# Altium footprint library Main_Board.PcbLib: 106 footprints (part 1 of 7)
Each footprint in its own frame and in the unit in brackets; x right, y up, seen from the top. Pads: shape width x height; smd on the part's side, far side on the other; paste and mask are expansions set on the pad; w line width, h text height; cw(c..) or ccw(c..) is an arc to the next point about the centre after c.
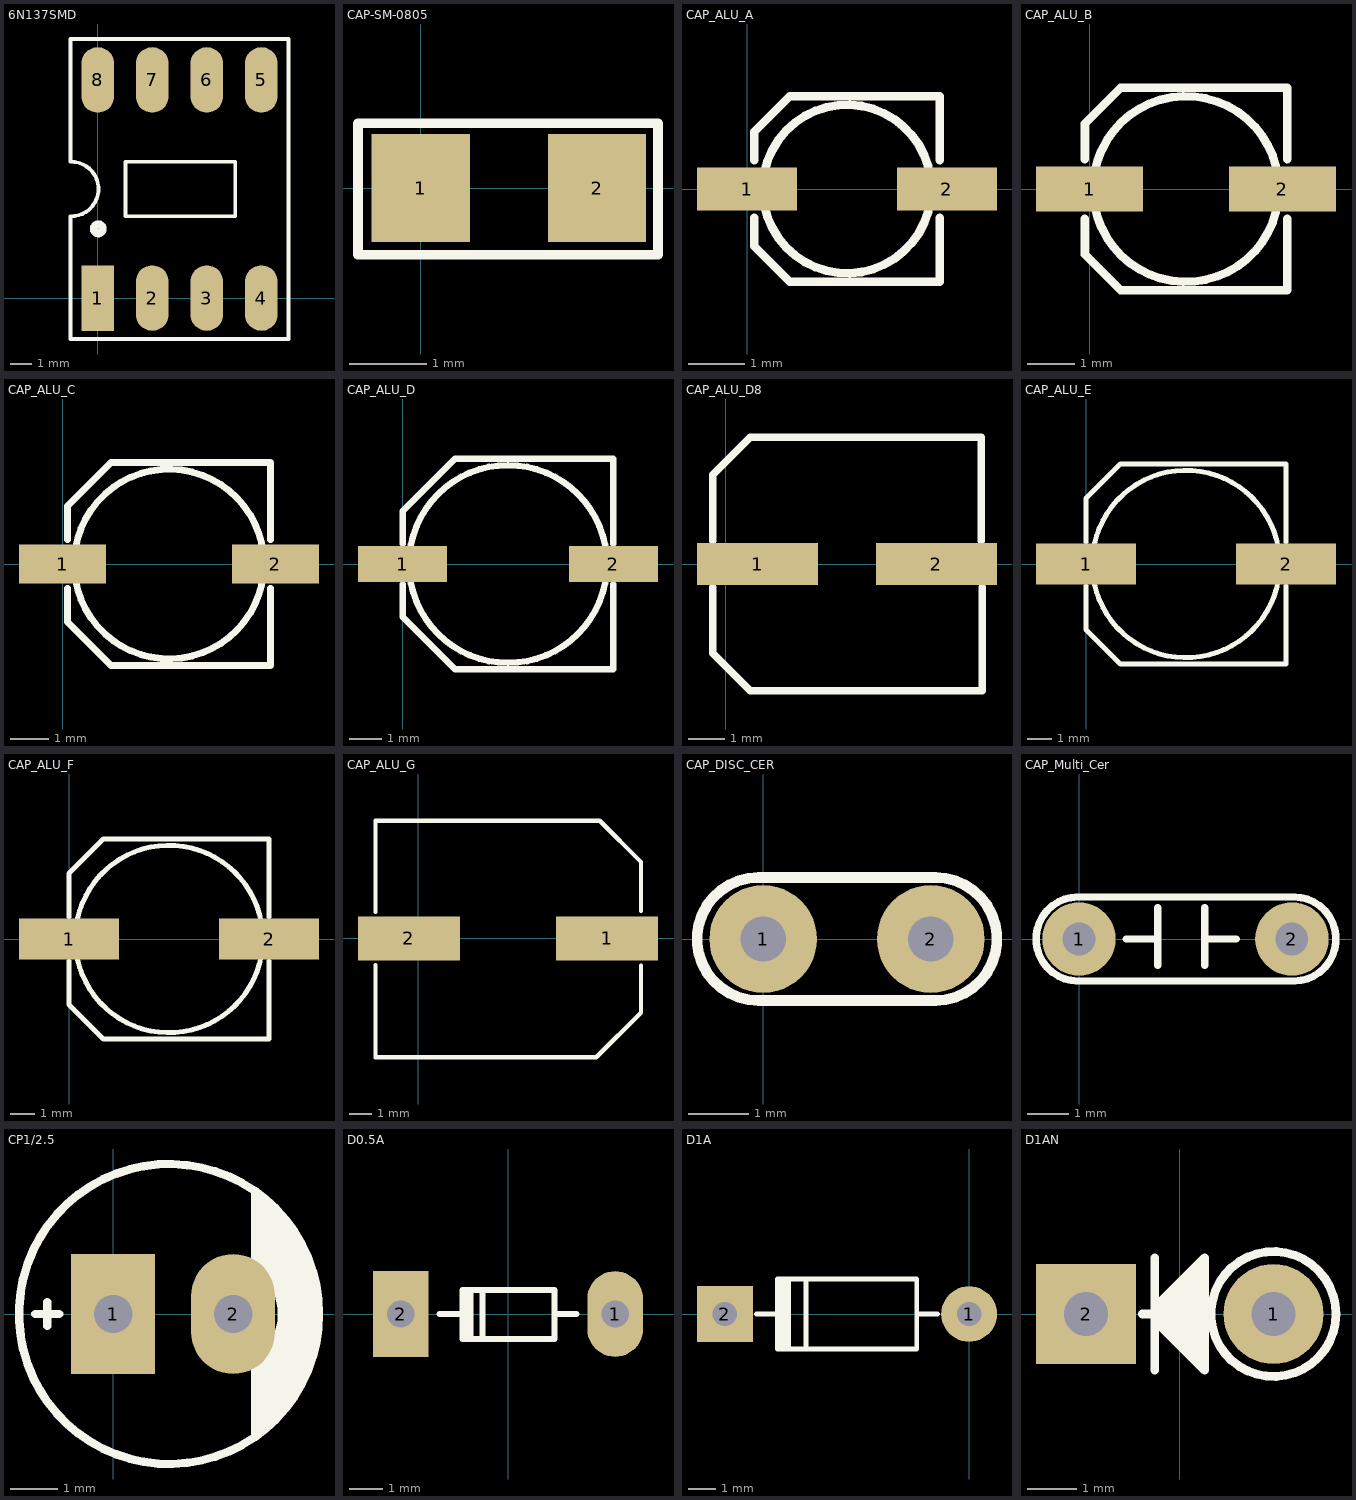
[diagram p0: the footprints below, top view; thin cyan lines are the x and y axes]

## 6N137SMD [mil] "8 PIN, W 400mil, Pin to pin 100mil"
height 100
pads (8):
  rect 60x120 smd: 1(0,0)
  oval 60x120 smd: 2(100,0) 3(200,0) 4(300,0) 5(300,400) 6(200,400) 7(100,400) 8(0,400)
Top Overlay:
  circle w15: c1,127 r8
  lines w7: -50.38,150.05 ccw(c-48.69,200.02) -50,250 ; -50,150 -50,-75 350,-75 350,475 -50,475 -50,251 ; 51,150 252,150 252,250 51,250 51,150
3D body "User Library-pdip8-smd.step": height 200, standoff 0, extent -45.08,-2.76 345.08,402.76

## CAP-SM-0805 [mil]
pads (2):
  rect 50x55 smd: 1(0,0) 2(90,0)
Top Overlay:
  lines w5: -32,-34 -32,33 121,33 121,-34 -32,-34
3D body "CAPC2012.STEP": height 46.62, standoff -0.62, extent 5.63,-18.43 84.37,17

## CAP_ALU_A [mil] "1uF -> 4.7uF"
height 8
pads (2):
  rect 70x30 smd: 1(0,0) 2(140,0)
Top Overlay:
  circle w6: c70,0 r59
  lines w6: 5,-20 5,-40 30,-65 135,-65 135,-20 ; 5,20 5,40 30,65 135,65 135,20
3D body "User Library-ALU-A.STEP": height 212.6, standoff 0, extent -0.86,-64.96 140.87,64.96

## CAP_ALU_B [mil] "10uF -> 22uF"
height 10
pads (2):
  rect 90x38 smd: 1(0,0) 2(162,0)
Top Overlay:
  circle w7: c81,0 r78
  lines w7: -4,-25 -4,-55 26,-85 166,-85 166,-25 ; -4,25 -4,55 26,85 166,85 166,25
3D body "User Library-ALU-B.STEP": height 212.6, standoff 0, extent -9.55,-84.65 171.55,84.65

## CAP_ALU_C [mil] "33uF"
height 10
pads (2):
  rect 90x40 smd: 1(0,0) 2(220,0)
Top Overlay:
  circle w7: c110,0 r98
  lines w7: 5,-25 5,-60 50,-105 215,-105 215,-25 ; 5,25 5,60 50,105 215,105 215,25
3D body "User Library-ALU-C.STEP": height 212.99, standoff 0, extent -6.14,-104.33 226.14,104.33

## CAP_ALU_D [mil] "47uF -> 100uF"
height 8
pads (2):
  rect 110x45 smd: 1(0,0) 2(260,0)
Top Overlay:
  circle w8: c130,0 r122
  lines w8: 0,-25 0,-65 65,-130 260,-130 260,-25 ; 0,25 0,65 65,130 260,130 260,25
3D body "User Library-ALU-D.STEP": height 212.6, standoff 0, extent -7.8,-129.92 267.79,129.92

## CAP_ALU_D8 [mil] "100uF -> 220uF"
height 8
pads (2):
  rect 130x45 smd: 1(34,0) 2(226,0)
Top Overlay:
  lines w8: -14,-25 -14,-96 26,-136 275,-136 275,-25 ; -14,25 -14,96 26,136 274,136 274,25
3D body "User Library-ALU-D8.STEP": height 303.15, standoff 0, extent -7.8,-129.92 267.8,129.92

## CAP_ALU_E [mil]
height 8
pads (2):
  rect 160x65 smd: 1(0,0) 2(320,0)
Top Overlay:
  circle w8: c160,0 r150
  lines w8: 0,-35 0,-105 55,-160 320,-160 320,-35 ; 0,35 0,105 55,160 320,160 320,35
3D body "User Library-ALU-E.STEP": height 244.09, standoff 0, extent -17.17,-163.39 337.16,163.38

## CAP_ALU_F [mil] "470uF"
height 8
pads (2):
  rect 160x65 smd: 1(0,0) 2(320,0)
Top Overlay:
  circle w8: c160,0 r150
  lines w8: 0,-35 0,-105 55,-160 320,-160 320,-35 ; 0,35 0,105 55,160 320,160 320,35
3D body "User Library-ALU-F.STEP": height 401.57, standoff 0, extent -34.88,-163.39 354.88,163.39

## CAP_ALU_G [mil]
pads (2):
  rect 180x78 smd: 1(334,0) 2(-16,0)
Top Overlay:
  lines w7: -75,-210.12 -75,-47 ; -75,47 -75,208 ; 394,-131.13 394,-48 ; 394,48 394,135
  lines w7.87: -75,-210.12 315.01,-210.12 394,-131.13 ; -75,208 321,208 394,135
3D body "CAP_ALU-G.STEP": height 401.57, standoff 0, extent -68.35,-203.76 388.34,201.75

## CAP_DISC_CER [mil]
height 200
pads (2):
  round 70 hole 29.53: 1(0,0) 2(109,0)
Top Overlay:
  lines w7: -3,-40 cw(c-3,0) -3,40 112,40 cw(c112,0) 112,-40 -3,-40
3D body "SW3dPS-Cap 100n.STEP": height 265, standoff -46.85, extent -61,-33.39 168.87,33.4

## CAP_Multi_Cer [mil]
height 200
pads (2):
  round 70 hole 31: 1(0,0) 2(203,0)
Top Overlay:
  lines w7: -3,-40 206,-40 ; -3,40 206,40 ; -1,-40 cw(c-1,0) -1,40 ; 45,0 75,0 ; 75,-25 75,30 ; 120,-25 120,30 ; 120,0 150,0 ; 205,-40 ccw(c205,0) 205,40
3D body "tu hoa 5mm.step": height 407.48, standoff -87.28, extent -54.96,-49.41 260,49.41

## CP1/2.5 [mil] "Tu hoa 33 >100 uF,50V, 220uF/16V,25V"
height 300
pads (2):
  rect 70x100 hole 32: 1(0,0)
  oval 70x100 hole 32: 2(100,0)
Top Overlay:
  circle w7: c46.58,0 r125
  region: 115,105 115,36 122,31 129,25 133,20 135,15 137,5 137,-6 135,-14 132,-19 128,-24 124,-28 120,-31 115,-34 115,-107 124,-99 139,-86 152,-69 167,-36 171,-15 171.58,0 167,30 153,67 131,93
  lines w7: -65,0 -45,0 ; -55,-10 -55,-5 -55,5 -55,10
3D body "User Library-CapAluRadial_D63H112P25.step": height 440.98, standoff -118.11, extent -77.04,-125 171.04,123.02

## D0.5A [mil] "Diode muoi, W 80mil, L 300mil"
height 80
pads (2):
  oval 65x100 hole 32: 1(125,0)
  rect 65x100 hole 32: 2(-125,0)
Top Overlay:
  rectangle: -55,-30 -40,25
  lines w7: -80,0 -53,0 ; -30,-29 -30,28 ; 54,0 80,0 ; -53,-29 54,-29 54,28 -53,28 -53,-29
3D body "SW3dPS-1N4148.STEP": height 61.22, standoff -50, extent -108.5,-32.96 108.5,32

## D1A [mil] "Diode 1A, W 100mil, L 350mil"
height 100
pads (2):
  round 80 hole 35: 1(0,0)
  rect 80x80 hole 35: 2(-350,0)
Top Overlay:
  rectangle: -275,-50 -255,50
  lines w7: -305,0 -275,0 ; -275,-16 -275,0 ; -275,21 -275,0 ; -234,-50 -234,47 ; -75,0 -45,0 ; -275,0 -275,50 -75,50 -75,-50 -275,-50 -275,0
3D body "SW3dPS-do_35.STEP": height 84.5, standoff -100, extent -386.49,-33 34.49,36

## D1AN [mil] "Diode 1A, W 100mil, L 150mil"
height 100
pads (2):
  round 80 hole 35: 1(75,0)
  rect 80x80 hole 35: 2(-75,0)
Top Overlay:
  circle w7: c75,0 r50
  region: 20,40 20,-40 15,-40 -20,-5 -20,5
  lines w7: -30,0 -20,0 ; -20,-45 -20,45 ; -20,-5 20,-45 20,45 -20,5 -20,-5
3D body "SW3dPS-1N4007_Stand.STEP": height 252.32, standoff -78.14, extent -64,-50 104,55